# Altium footprint library DS3231_2.PcbLib: 1 footprints
Each footprint in its own frame and in the unit in brackets; x right, y up, seen from the top. Pads: shape width x height; smd on the part's side, far side on the other; paste and mask are expansions set on the pad; w line width, h text height; cw(c..) or ccw(c..) is an arc to the next point about the centre after c.
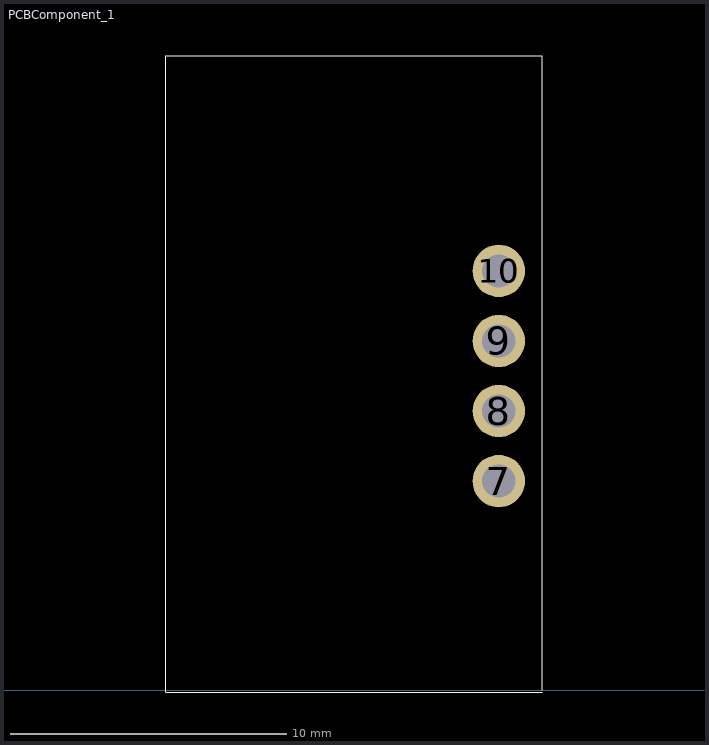
[diagram p0: the footprint, top view; thin cyan lines are the x and y axes]

## PCBComponent_1 [mm]
pads (5):
  round 1.9 hole 1.2 mask+0.076: 7(21.425,7.58) 8(21.425,10.12) 9(21.425,12.66) 10(21.425,15.2) 10(21.425,15.2)
Top Overlay:
  lines w0.005: 23,-0.075 9.35,-0.075 9.35,23 23,23 23,0
3D body "DS3231 RTC.SLDPRT": height 45.45, standoff 0.7, extent 9.44,0.05 22.97,22.85